# Altium schematic symbol library Analog Devices Operational Amplifiers.SchLib: 2102 symbols (part 27 of 35) (continued)
## ADA4851-4WYRUZ-R7
designator U?
Quad Channel Low Power Operational Amplifier, 130 MHz BW, 375 V/us SR, Industrial, 14-pin SOP (RU-14), Reel; Generic Part Number: ADA4851-4; Manufacturer: Analog Devices; PartNumber: ADA4851-4WYRUZ-R7; Amplifiers Per Package: 4; Automotive Qualified: Yes; Input Bias Current: 1.8uA; Input Offset Voltage: 600uV; Iq/Amp: 3.2mA; Small Signal Bandwidth: 130MHz; V Span Max: 12V; V Span Min: 2.7V; DatasheetVersion: Rev. J; PackageReference: RU-14; PackageDescription: 14-Pin Thin Shrink Small Outline Package, Body 5 x 4.4 mm, Pitch 0.65 mm; Supplier 1: Digi-Key; Supplier Part Number 1: ADA4851-4WYRUZ-R7TR-ND; Supplier 2: Digi-Key; Supplier Part Number 2: ADA4851-4WYRUZ-R7CT-ND; Supplier 3: Digi-Key; Supplier Part Number 3: ADA4851-4WYRUZ-R7DKR-ND; Supplier 4: Newark; Supplier Part Number 4: 14R8665; Slew Rate: 375V/us; Mounting Technology: Surface Mount; Code_JEDEC: MO-153AB-1; ComponentLink1Description: Manufacturer URL; ComponentLink1URL: http://www.analog.com/en/index.html; ComponentLink2Description: Datasheet; ComponentLink2URL: http://www.analog.com/static/imported-files/data_sheets/ADA4851-1_4851-2_4851-4.pdf; ComponentLink3Description: Package Specification; ComponentLink3URL: http://www.analog.com/static/imported-files/packages/36057385283879153717235186773RU14.pdf
footprint ADI-RU-14_N (SOP, 14-Leads, Body 5x4.4mm, Pitch 0.65mm, IPC Medium Density)
footprint ADI-RU-14_L (SOP, 14-Leads, Body 5x4.4mm, Pitch 0.65mm, IPC High Density)
footprint ADI-RU-14_M (SOP, 14-Leads, Body 5x4.4mm, Pitch 0.65mm, IPC Low Density)
pins on every part: 4 +VS (power), 11 -VS (power)
part A pins: 1 VOUT 1 (out), 2 -IN 1 (in), 3 +IN 1 (in)
part B pins: 5 +IN 2 (in), 6 -IN 2 (in), 7 VOUT 2 (out)
part C pins: 8 VOUT 3 (out), 9 -IN 3 (in), 10 +IN 3 (in)
part D pins: 12 +IN 4 (in), 13 -IN 4 (in), 14 VOUT 4 (out)

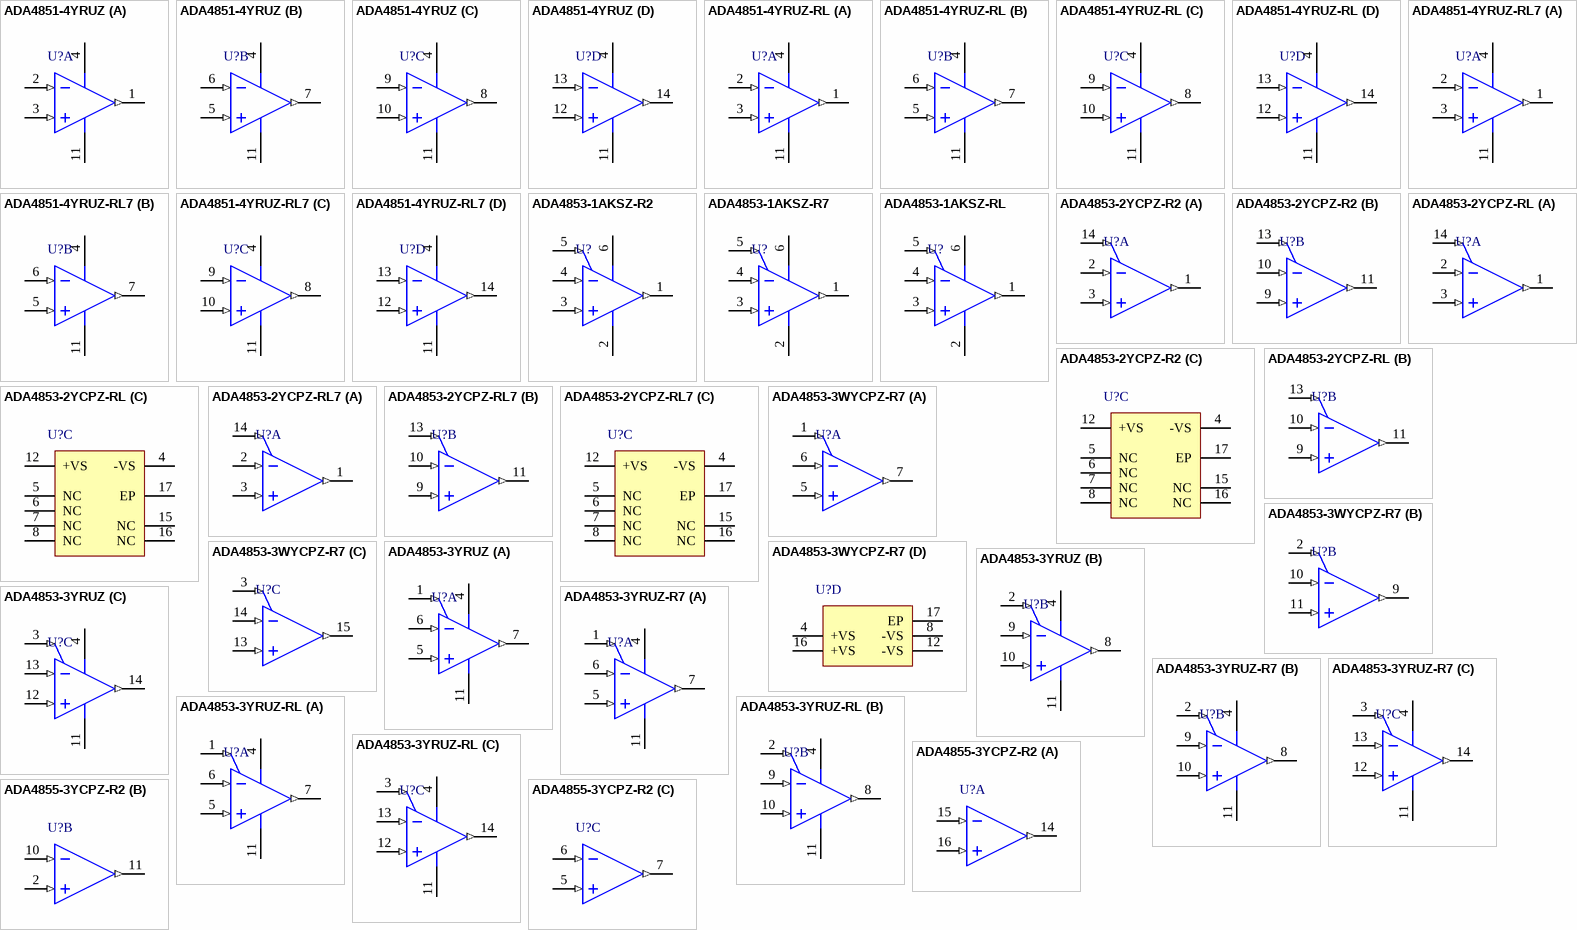
[diagram p84: symbols ADA4851-4YRUZ to ADA4855-3YCPZ-R2]

## ADA4851-4YRUZ
designator U?
Quad Channel Low Power Operational Amplifier, 130 MHz BW, 375 V/us SR, Industrial, 14-pin SOP (RU-14), Tube; Generic Part Number: ADA4851-4; Manufacturer: Analog Devices; PartNumber: ADA4851-4YRUZ; Amplifiers Per Package: 4; Automotive Qualified: Yes; Input Bias Current: 1.8uA; Input Offset Voltage: 600uV; Iq/Amp: 3.2mA; Small Signal Bandwidth: 130MHz; V Span Max: 12V; V Span Min: 2.7V; DatasheetVersion: Rev. J; PackageReference: RU-14; PackageDescription: 14-Pin Thin Shrink Small Outline Package, Body 5 x 4.4 mm, Pitch 0.65 mm; Supplier 1: Digi-Key; Supplier Part Number 1: ADA4851-4YRUZ-ND; Supplier 2: Farnell; Supplier Part Number 2: 1078230; Supplier 3: Newark; Supplier Part Number 3: 19M0649; Slew Rate: 375V/us; Mounting Technology: Surface Mount; Code_JEDEC: MO-153AB-1; ComponentLink1Description: Manufacturer URL; ComponentLink1URL: http://www.analog.com/en/index.html; ComponentLink2Description: Datasheet; ComponentLink2URL: http://www.analog.com/static/imported-files/data_sheets/ADA4851-1_4851-2_4851-4.pdf; ComponentLink3Description: Package Specification; ComponentLink3URL: http://www.analog.com/static/imported-files/packages/36057385283879153717235186773RU14.pdf
footprint ADI-RU-14_N (SOP, 14-Leads, Body 5x4.4mm, Pitch 0.65mm, IPC Medium Density)
footprint ADI-RU-14_L (SOP, 14-Leads, Body 5x4.4mm, Pitch 0.65mm, IPC High Density)
footprint ADI-RU-14_M (SOP, 14-Leads, Body 5x4.4mm, Pitch 0.65mm, IPC Low Density)
pins on every part: 4 +VS (power), 11 -VS (power)
part A pins: 1 VOUT 1 (out), 2 -IN 1 (in), 3 +IN 1 (in)
part B pins: 5 +IN 2 (in), 6 -IN 2 (in), 7 VOUT 2 (out)
part C pins: 8 VOUT 3 (out), 9 -IN 3 (in), 10 +IN 3 (in)
part D pins: 12 +IN 4 (in), 13 -IN 4 (in), 14 VOUT 4 (out)

## ADA4851-4YRUZ-RL
designator U?
Quad Channel Low Power Operational Amplifier, 130 MHz BW, 375 V/us SR, Industrial, 14-pin SOP (RU-14), Reel; Generic Part Number: ADA4851-4; Manufacturer: Analog Devices; PartNumber: ADA4851-4YRUZ-RL; Amplifiers Per Package: 4; Automotive Qualified: Yes; Input Bias Current: 1.8uA; Input Offset Voltage: 600uV; Iq/Amp: 3.2mA; Small Signal Bandwidth: 130MHz; V Span Max: 12V; V Span Min: 2.7V; DatasheetVersion: Rev. J; PackageReference: RU-14; PackageDescription: 14-Pin Thin Shrink Small Outline Package, Body 5 x 4.4 mm, Pitch 0.65 mm; Supplier 1: Digi-Key; Supplier Part Number 1: ADA4851-4YRUZ-RL-ND; Slew Rate: 375V/us; Mounting Technology: Surface Mount; Code_JEDEC: MO-153AB-1; ComponentLink1Description: Manufacturer URL; ComponentLink1URL: http://www.analog.com/en/index.html; ComponentLink2Description: Datasheet; ComponentLink2URL: http://www.analog.com/static/imported-files/data_sheets/ADA4851-1_4851-2_4851-4.pdf; ComponentLink3Description: Package Specification; ComponentLink3URL: http://www.analog.com/static/imported-files/packages/36057385283879153717235186773RU14.pdf
footprint ADI-RU-14_N (SOP, 14-Leads, Body 5x4.4mm, Pitch 0.65mm, IPC Medium Density)
footprint ADI-RU-14_L (SOP, 14-Leads, Body 5x4.4mm, Pitch 0.65mm, IPC High Density)
footprint ADI-RU-14_M (SOP, 14-Leads, Body 5x4.4mm, Pitch 0.65mm, IPC Low Density)
pins on every part: 4 +VS (power), 11 -VS (power)
part A pins: 1 VOUT 1 (out), 2 -IN 1 (in), 3 +IN 1 (in)
part B pins: 5 +IN 2 (in), 6 -IN 2 (in), 7 VOUT 2 (out)
part C pins: 8 VOUT 3 (out), 9 -IN 3 (in), 10 +IN 3 (in)
part D pins: 12 +IN 4 (in), 13 -IN 4 (in), 14 VOUT 4 (out)

## ADA4851-4YRUZ-RL7
designator U?
Quad Channel Low Power Operational Amplifier, 130 MHz BW, 375 V/us SR, Industrial, 14-pin SOP (RU-14), Reel; Generic Part Number: ADA4851-4; Manufacturer: Analog Devices; PartNumber: ADA4851-4YRUZ-RL7; Amplifiers Per Package: 4; Automotive Qualified: Yes; Input Bias Current: 1.8uA; Input Offset Voltage: 600uV; Iq/Amp: 3.2mA; Small Signal Bandwidth: 130MHz; V Span Max: 12V; V Span Min: 2.7V; DatasheetVersion: Rev. J; PackageReference: RU-14; PackageDescription: 14-Pin Thin Shrink Small Outline Package, Body 5 x 4.4 mm, Pitch 0.65 mm; Supplier 1: Digi-Key; Supplier Part Number 1: ADA4851-4YRUZ-RL7TR-ND; Supplier 2: Digi-Key; Supplier Part Number 2: ADA4851-4YRUZ-RL7CT-ND; Supplier 3: Digi-Key; Supplier Part Number 3: ADA4851-4YRUZ-RL7DKR-ND; Supplier 4: Newark; Supplier Part Number 4: 59K0911; Slew Rate: 375V/us; Mounting Technology: Surface Mount; Code_JEDEC: MO-153AB-1; ComponentLink1Description: Manufacturer URL; ComponentLink1URL: http://www.analog.com/en/index.html; ComponentLink2Description: Datasheet; ComponentLink2URL: http://www.analog.com/static/imported-files/data_sheets/ADA4851-1_4851-2_4851-4.pdf; ComponentLink3Description: Package Specification; ComponentLink3URL: http://www.analog.com/static/imported-files/packages/36057385283879153717235186773RU14.pdf
footprint ADI-RU-14_N (SOP, 14-Leads, Body 5x4.4mm, Pitch 0.65mm, IPC Medium Density)
footprint ADI-RU-14_L (SOP, 14-Leads, Body 5x4.4mm, Pitch 0.65mm, IPC High Density)
footprint ADI-RU-14_M (SOP, 14-Leads, Body 5x4.4mm, Pitch 0.65mm, IPC Low Density)
pins on every part: 4 +VS (power), 11 -VS (power)
part A pins: 1 VOUT 1 (out), 2 -IN 1 (in), 3 +IN 1 (in)
part B pins: 5 +IN 2 (in), 6 -IN 2 (in), 7 VOUT 2 (out)
part C pins: 8 VOUT 3 (out), 9 -IN 3 (in), 10 +IN 3 (in)
part D pins: 12 +IN 4 (in), 13 -IN 4 (in), 14 VOUT 4 (out)

## ADA4853-1AKSZ-R2
designator U?
Single Channel Ultra Low Power-Down Current Operational Amplifier, 90MHz BW, 100 V/us SR, Industrial, 6-pin SOT23 (KS-6), Reel; Generic Part Number: ADA4853-1; Manufacturer: Analog Devices; PartNumber: ADA4853-1AKSZ-R2; Amplifiers Per Package: 1; Input Bias Current: 1uA; Input Offset Voltage: 1mV; Iq/Amp: 1.6mA; V Span Max: 5V; V Span Min: 2.65V; DatasheetVersion: Rev. F; PackageVersion: 072809-A; PackageReference: KS-6; PackageDescription: 6-Pin Thin Shrink Small Outline Transistor Package, Body 2 x 1.25 mm, Pitch 0.65 mm; Supplier 1: Digi-Key; Supplier Part Number 1: ADA4853-1AKSZ-R2CT-ND; Supplier 2: Digi-Key; Supplier Part Number 2: ADA4853-1AKSZ-R2DKR-ND; Supplier 3: Farnell; Supplier Part Number 3: 2192170; Supplier 4: Newark; Supplier Part Number 4: 12M7610; Slew Rate: 100V/us; Small Signal Bandwidth: 90MHz; Mounting Technology: Surface Mount; Code_JEDEC: MO-203-AB; ComponentLink1Description: Manufacturer URL; ComponentLink1URL: http://www.analog.com/en/index.html; ComponentLink2Description: Datasheet; ComponentLink2URL: http://www.analog.com/static/imported-files/data_sheets/ADA4853-1_4853-2_4853-3.pdf; ComponentLink3Description: Package Specification; ComponentLink3URL: http://www.analog.com/static/imported-files/packages/PKG_PDF/SC70(KS)/KS_6.pdf; ComponentLink4Description: Reference Circuit; ComponentLink4URL: http://www.analog.com/en/all-operational-amplifiers-op-amps/operational-amplifiers-op-amps/ada4853-1/products/product.html#product-recommendations
footprint ADI-KS-6_N (SOT23, 6-Leads, Body 2x1.25mm, Pitch 0.65mm, IPC Medium Density)
footprint ADI-KS-6_L (SOT23, 6-Leads, Body 2x1.25mm, Pitch 0.65mm, IPC High Density)
footprint ADI-KS-6_M (SOT23, 6-Leads, Body 2x1.25mm, Pitch 0.65mm, IPC Low Density)
pins: 1 VOUT (out), 2 -VS (power), 3 +IN (in), 4 -IN (in), 5 DISABLE (in), 6 +VS (power)

## ADA4853-1AKSZ-R7
designator U?
Single Channel Ultra Low Power-Down Current Operational Amplifier, 90MHz BW, 100 V/us SR, Industrial, 6-pin SOT23 (KS-6), Reel; Generic Part Number: ADA4853-1; Manufacturer: Analog Devices; PartNumber: ADA4853-1AKSZ-R7; Amplifiers Per Package: 1; Input Bias Current: 1uA; Input Offset Voltage: 1mV; Iq/Amp: 1.6mA; V Span Max: 5V; V Span Min: 2.65V; DatasheetVersion: Rev. F; PackageVersion: 072809-A; PackageReference: KS-6; PackageDescription: 6-Pin Thin Shrink Small Outline Transistor Package, Body 2 x 1.25 mm, Pitch 0.65 mm; Supplier 1: Digi-Key; Supplier Part Number 1: ADA4853-1AKSZ-R7TR-ND; Supplier 2: Digi-Key; Supplier Part Number 2: ADA4853-1AKSZ-R7CT-ND; Supplier 3: Digi-Key; Supplier Part Number 3: ADA4853-1AKSZ-R7DKR-ND; Supplier 4: Newark; Supplier Part Number 4: 12M7611; Supplier 5: Newark; Supplier Part Number 5: 67W2626; Slew Rate: 100V/us; Small Signal Bandwidth: 90MHz; Mounting Technology: Surface Mount; Code_JEDEC: MO-203-AB; ComponentLink1Description: Manufacturer URL; ComponentLink1URL: http://www.analog.com/en/index.html; ComponentLink2Description: Datasheet; ComponentLink2URL: http://www.analog.com/static/imported-files/data_sheets/ADA4853-1_4853-2_4853-3.pdf; ComponentLink3Description: Package Specification; ComponentLink3URL: http://www.analog.com/static/imported-files/packages/PKG_PDF/SC70(KS)/KS_6.pdf; ComponentLink4Description: Reference Circuit; ComponentLink4URL: http://www.analog.com/en/all-operational-amplifiers-op-amps/operational-amplifiers-op-amps/ada4853-1/products/product.html#product-recommendations
footprint ADI-KS-6_N (SOT23, 6-Leads, Body 2x1.25mm, Pitch 0.65mm, IPC Medium Density)
footprint ADI-KS-6_L (SOT23, 6-Leads, Body 2x1.25mm, Pitch 0.65mm, IPC High Density)
footprint ADI-KS-6_M (SOT23, 6-Leads, Body 2x1.25mm, Pitch 0.65mm, IPC Low Density)
pins: 1 VOUT (out), 2 -VS (power), 3 +IN (in), 4 -IN (in), 5 DISABLE (in), 6 +VS (power)

## ADA4853-1AKSZ-RL
designator U?
Single Channel Ultra Low Power-Down Current Operational Amplifier, 90MHz BW, 100 V/us SR, Industrial, 6-pin SOT23 (KS-6), Reel; Generic Part Number: ADA4853-1; Manufacturer: Analog Devices; PartNumber: ADA4853-1AKSZ-RL; Amplifiers Per Package: 1; Input Bias Current: 1uA; Input Offset Voltage: 1mV; Iq/Amp: 1.6mA; V Span Max: 5V; V Span Min: 2.65V; DatasheetVersion: Rev. F; PackageVersion: 072809-A; PackageReference: KS-6; PackageDescription: 6-Pin Thin Shrink Small Outline Transistor Package, Body 2 x 1.25 mm, Pitch 0.65 mm; Supplier 1: Digi-Key; Supplier Part Number 1: ADA4853-1AKSZ-RL-ND; Slew Rate: 100V/us; Small Signal Bandwidth: 90MHz; Mounting Technology: Surface Mount; Code_JEDEC: MO-203-AB; ComponentLink1Description: Manufacturer URL; ComponentLink1URL: http://www.analog.com/en/index.html; ComponentLink2Description: Datasheet; ComponentLink2URL: http://www.analog.com/static/imported-files/data_sheets/ADA4853-1_4853-2_4853-3.pdf; ComponentLink3Description: Package Specification; ComponentLink3URL: http://www.analog.com/static/imported-files/packages/PKG_PDF/SC70(KS)/KS_6.pdf; ComponentLink4Description: Reference Circuit; ComponentLink4URL: http://www.analog.com/en/all-operational-amplifiers-op-amps/operational-amplifiers-op-amps/ada4853-1/products/product.html#product-recommendations
footprint ADI-KS-6_N (SOT23, 6-Leads, Body 2x1.25mm, Pitch 0.65mm, IPC Medium Density)
footprint ADI-KS-6_L (SOT23, 6-Leads, Body 2x1.25mm, Pitch 0.65mm, IPC High Density)
footprint ADI-KS-6_M (SOT23, 6-Leads, Body 2x1.25mm, Pitch 0.65mm, IPC Low Density)
pins: 1 VOUT (out), 2 -VS (power), 3 +IN (in), 4 -IN (in), 5 DISABLE (in), 6 +VS (power)

## ADA4853-2YCPZ-R2
designator U?
Double Channel Ultra Low Power-Down Current Operational Amplifier, 100 MHz BW, 120 V/us SR, Industrial, 16-pin QFN (CP-16-3), Reel; Generic Part Number: ADA4853-2; Manufacturer: Analog Devices; PartNumber: ADA4853-2YCPZ-R2; Amplifiers Per Package: 2; Input Bias Current: 1uA; Input Offset Voltage: 2mV; Iq/Amp: 1.6mA; Small Signal Bandwidth: 100MHz; V Span Max: 5V; V Span Min: 2.65V; DatasheetVersion: Rev. F; PackageReference: CP-16-3; PackageDescription: 16-Pin Lead Frame Chip Scale Package, Body 3 x 3 mm, Pitch 0.5 mm; Supplier 1: Digi-Key; Supplier Part Number 1: ADA4853-2YCPZ-R2CT-ND; Supplier 2: Digi-Key; Supplier Part Number 2: ADA4853-2YCPZ-R2DKR-ND; Slew Rate: 120V/us; Mounting Technology: Surface Mount; Code_JEDEC: MO-220-VEED-2; ComponentLink1Description: Manufacturer URL; ComponentLink1URL: http://www.analog.com/en/index.html; ComponentLink2Description: Datasheet; ComponentLink2URL: http://www.analog.com/static/imported-files/data_sheets/ADA4853-1_4853-2_4853-3.pdf; ComponentLink3Description: Package Specification; ComponentLink3URL: http://www.analog.com/static/imported-files/packages/PKG_PDF/LFCSP(CP)/CP_16_3.pdf; ComponentLink4Description: Reference Circuit; ComponentLink4URL: http://www.analog.com/en/all-operational-amplifiers-op-amps/operational-amplifiers-op-amps/ada4853-2/products/product.html#product-recommendations
footprint ADI-CP-16-3_N (QFN, 16-Leads, Body 3x3mm, Pitch 0.5mm, Thermal Pad 1.5x1.5mm, IPC Medium Density)
footprint ADI-CP-16-3_L (QFN, 16-Leads, Body 3x3mm, Pitch 0.5mm, Thermal Pad 1.5x1.5mm, IPC High Density)
footprint ADI-CP-16-3_M (QFN, 16-Leads, Body 3x3mm, Pitch 0.5mm, Thermal Pad 1.5x1.5mm, IPC Low Density)
part A pins: 1 VOUT 1 (out), 2 -IN 1 (in), 3 +IN 1 (in), 14 DISABLE 1 (in)
part B pins: 9 +IN 2 (in), 10 -IN 2 (in), 11 VOUT 2 (out), 13 DISABLE 2 (in)
part C pins: 4 -VS (power), 5 NC, 6 NC, 7 NC, 8 NC, 12 +VS (power), 15 NC, 16 NC, 17 EP (power) "EXPOSED DIE PAD MUST BE CONNECTED TO GND."

## ADA4853-2YCPZ-RL
designator U?
Double Channel Ultra Low Power-Down Current Operational Amplifier, 100 MHz BW, 120 V/us SR, Industrial, 16-pin QFN (CP-16-3), Reel; Generic Part Number: ADA4853-2; Manufacturer: Analog Devices; PartNumber: ADA4853-2YCPZ-RL; Amplifiers Per Package: 2; Input Bias Current: 1uA; Input Offset Voltage: 2mV; Iq/Amp: 1.6mA; Small Signal Bandwidth: 100MHz; V Span Max: 5V; V Span Min: 2.65V; DatasheetVersion: Rev. F; PackageReference: CP-16-3; PackageDescription: 16-Pin Lead Frame Chip Scale Package, Body 3 x 3 mm, Pitch 0.5 mm; Supplier 1: Digi-Key; Supplier Part Number 1: ADA4853-2YCPZ-RL-ND; Slew Rate: 120V/us; Mounting Technology: Surface Mount; Code_JEDEC: MO-220-VEED-2; ComponentLink1Description: Manufacturer URL; ComponentLink1URL: http://www.analog.com/en/index.html; ComponentLink2Description: Datasheet; ComponentLink2URL: http://www.analog.com/static/imported-files/data_sheets/ADA4853-1_4853-2_4853-3.pdf; ComponentLink3Description: Package Specification; ComponentLink3URL: http://www.analog.com/static/imported-files/packages/PKG_PDF/LFCSP(CP)/CP_16_3.pdf; ComponentLink4Description: Reference Circuit; ComponentLink4URL: http://www.analog.com/en/all-operational-amplifiers-op-amps/operational-amplifiers-op-amps/ada4853-2/products/product.html#product-recommendations
footprint ADI-CP-16-3_N (QFN, 16-Leads, Body 3x3mm, Pitch 0.5mm, Thermal Pad 1.5x1.5mm, IPC Medium Density)
footprint ADI-CP-16-3_L (QFN, 16-Leads, Body 3x3mm, Pitch 0.5mm, Thermal Pad 1.5x1.5mm, IPC High Density)
footprint ADI-CP-16-3_M (QFN, 16-Leads, Body 3x3mm, Pitch 0.5mm, Thermal Pad 1.5x1.5mm, IPC Low Density)
part A pins: 1 VOUT 1 (out), 2 -IN 1 (in), 3 +IN 1 (in), 14 DISABLE 1 (in)
part B pins: 9 +IN 2 (in), 10 -IN 2 (in), 11 VOUT 2 (out), 13 DISABLE 2 (in)
part C pins: 4 -VS (power), 5 NC, 6 NC, 7 NC, 8 NC, 12 +VS (power), 15 NC, 16 NC, 17 EP (power) "EXPOSED DIE PAD MUST BE CONNECTED TO GND."

## ADA4853-2YCPZ-RL7
designator U?
Double Channel Ultra Low Power-Down Current Operational Amplifier, 100 MHz BW, 120 V/us SR, Industrial, 16-pin QFN (CP-16-3), Reel; Generic Part Number: ADA4853-2; Manufacturer: Analog Devices; PartNumber: ADA4853-2YCPZ-RL7; Amplifiers Per Package: 2; Input Bias Current: 1uA; Input Offset Voltage: 2mV; Iq/Amp: 1.6mA; Small Signal Bandwidth: 100MHz; V Span Max: 5V; V Span Min: 2.65V; DatasheetVersion: Rev. F; PackageReference: CP-16-3; PackageDescription: 16-Pin Lead Frame Chip Scale Package, Body 3 x 3 mm, Pitch 0.5 mm; Supplier 1: Digi-Key; Supplier Part Number 1: ADA4853-2YCPZ-RL7TR-ND; Supplier 2: Digi-Key; Supplier Part Number 2: ADA4853-2YCPZ-RL7CT-ND; Supplier 3: Digi-Key; Supplier Part Number 3: ADA4853-2YCPZ-RL7DKR-ND; Slew Rate: 120V/us; Mounting Technology: Surface Mount; Code_JEDEC: MO-220-VEED-2; ComponentLink1Description: Manufacturer URL; ComponentLink1URL: http://www.analog.com/en/index.html; ComponentLink2Description: Datasheet; ComponentLink2URL: http://www.analog.com/static/imported-files/data_sheets/ADA4853-1_4853-2_4853-3.pdf; ComponentLink3Description: Package Specification; ComponentLink3URL: http://www.analog.com/static/imported-files/packages/PKG_PDF/LFCSP(CP)/CP_16_3.pdf; ComponentLink4Description: Reference Circuit; ComponentLink4URL: http://www.analog.com/en/all-operational-amplifiers-op-amps/operational-amplifiers-op-amps/ada4853-2/products/product.html#product-recommendations
footprint ADI-CP-16-3_N (QFN, 16-Leads, Body 3x3mm, Pitch 0.5mm, Thermal Pad 1.5x1.5mm, IPC Medium Density)
footprint ADI-CP-16-3_L (QFN, 16-Leads, Body 3x3mm, Pitch 0.5mm, Thermal Pad 1.5x1.5mm, IPC High Density)
footprint ADI-CP-16-3_M (QFN, 16-Leads, Body 3x3mm, Pitch 0.5mm, Thermal Pad 1.5x1.5mm, IPC Low Density)
part A pins: 1 VOUT 1 (out), 2 -IN 1 (in), 3 +IN 1 (in), 14 DISABLE 1 (in)
part B pins: 9 +IN 2 (in), 10 -IN 2 (in), 11 VOUT 2 (out), 13 DISABLE 2 (in)
part C pins: 4 -VS (power), 5 NC, 6 NC, 7 NC, 8 NC, 12 +VS (power), 15 NC, 16 NC, 17 EP (power) "EXPOSED DIE PAD MUST BE CONNECTED TO GND."

## ADA4853-3WYCPZ-R7
designator U?
3 Channel Ultra Low Power-Down Current Operational Amplifier, 100 MHz BW, 120 V/us SR, Industrial, 16-pin QFN (CP-16-3), Reel; Generic Part Number: ADA4853-3; Manufacturer: Analog Devices; PartNumber: ADA4853-3WYCPZ-R7; Amplifiers Per Package: 3; Automotive Qualified: Yes; Input Bias Current: 1uA; Input Offset Voltage: 1mV; Iq/Amp: 1.4mA; Small Signal Bandwidth: 100MHz; V Span Max: 5V; V Span Min: 2.65V; DatasheetVersion: Rev. F; PackageReference: CP-16-3; PackageDescription: 16-Pin Lead Frame Chip Scale Package, Body 3 x 3 mm, Pitch 0.5 mm; Slew Rate: 120V/us; Mounting Technology: Surface Mount; Code_JEDEC: MO-220-VEED-2; ComponentLink1Description: Manufacturer URL; ComponentLink1URL: http://www.analog.com/en/index.html; ComponentLink2Description: Datasheet; ComponentLink2URL: http://www.analog.com/static/imported-files/data_sheets/ADA4853-1_4853-2_4853-3.pdf; ComponentLink3Description: Package Specification; ComponentLink3URL: http://www.analog.com/static/imported-files/packages/PKG_PDF/LFCSP(CP)/CP_16_3.pdf; ComponentLink4Description: Reference Circuit; ComponentLink4URL: http://www.analog.com/en/all-operational-amplifiers-op-amps/operational-amplifiers-op-amps/ada4853-3/products/product.html#product-recommendations
footprint ADI-CP-16-3_N (QFN, 16-Leads, Body 3x3mm, Pitch 0.5mm, Thermal Pad 1.5x1.5mm, IPC Medium Density)
footprint ADI-CP-16-3_L (QFN, 16-Leads, Body 3x3mm, Pitch 0.5mm, Thermal Pad 1.5x1.5mm, IPC High Density)
footprint ADI-CP-16-3_M (QFN, 16-Leads, Body 3x3mm, Pitch 0.5mm, Thermal Pad 1.5x1.5mm, IPC Low Density)
part A pins: 1 DISABLE 1 (in), 5 +IN 1 (in), 6 -IN 1 (in), 7 VOUT 1 (out)
part B pins: 2 DISABLE 2 (in), 9 VOUT 2 (out), 10 -IN 2 (in), 11 +IN 2 (in)
part C pins: 3 DISABLE 3 (in), 13 +IN 3 (in), 14 -IN 3 (in), 15 VOUT 3 (out)
part D pins: 4 +VS (power), 8 -VS (power), 12 -VS (power), 16 +VS (power), 17 EP (power)

## ADA4853-3YRUZ
designator U?
3 Channel Ultra Low Power-Down Current Operational Amplifier, 100 MHz BW, 120 V/us SR, Industrial, 14-pin SOP (RU-14), Tube; Generic Part Number: ADA4853-3; Manufacturer: Analog Devices; PartNumber: ADA4853-3YRUZ; Amplifiers Per Package: 3; Automotive Qualified: Yes; Input Bias Current: 1uA; Input Offset Voltage: 1mV; Iq/Amp: 1.4mA; Small Signal Bandwidth: 100MHz; V Span Max: 5V; V Span Min: 2.65V; DatasheetVersion: Rev. F; PackageReference: RU-14; PackageDescription: 14-Pin Thin Shrink Small Outline Package, Body 5 x 4.4 mm, Pitch 0.65 mm; Supplier 1: Digi-Key; Supplier Part Number 1: ADA4853-3YRUZ-ND; Supplier 2: Farnell; Supplier Part Number 2: 1498692; Supplier 3: Newark; Supplier Part Number 3: 15P0326; Slew Rate: 120V/us; Mounting Technology: Surface Mount; Code_JEDEC: MO-153AB-1; ComponentLink1Description: Manufacturer URL; ComponentLink1URL: http://www.analog.com/en/index.html; ComponentLink2Description: Datasheet; ComponentLink2URL: http://www.analog.com/static/imported-files/data_sheets/ADA4853-1_4853-2_4853-3.pdf; ComponentLink3Description: Package Specification; ComponentLink3URL: http://www.analog.com/static/imported-files/packages/36057385283879153717235186773RU14.pdf; ComponentLink4Description: Reference Circuit; ComponentLink4URL: http://www.analog.com/en/all-operational-amplifiers-op-amps/operational-amplifiers-op-amps/ada4853-3/products/product.html#product-recommendations
footprint ADI-RU-14_N (SOP, 14-Leads, Body 5x4.4mm, Pitch 0.65mm, IPC Medium Density)
footprint ADI-RU-14_L (SOP, 14-Leads, Body 5x4.4mm, Pitch 0.65mm, IPC High Density)
footprint ADI-RU-14_M (SOP, 14-Leads, Body 5x4.4mm, Pitch 0.65mm, IPC Low Density)
pins on every part: 4 +VS (power), 11 -VS (power)
part A pins: 1 DISABLE 1 (in), 5 +IN 1 (in), 6 -IN 1 (in), 7 VOUT 1 (out)
part B pins: 2 DISABLE 2 (in), 8 VOUT 2 (out), 9 -IN 2 (in), 10 +IN 2 (in)
part C pins: 3 DISABLE 3 (in), 12 +IN 3 (in), 13 -IN 3 (in), 14 VOUT 3 (out)

## ADA4853-3YRUZ-R7
designator U?
3 Channel Ultra Low Power-Down Current Operational Amplifier, 100 MHz BW, 120 V/us SR, Industrial, 14-pin SOP (RU-14), Reel; Generic Part Number: ADA4853-3; Manufacturer: Analog Devices; PartNumber: ADA4853-3YRUZ-R7; Amplifiers Per Package: 3; Automotive Qualified: Yes; Input Bias Current: 1uA; Input Offset Voltage: 1mV; Iq/Amp: 1.4mA; Small Signal Bandwidth: 100MHz; V Span Max: 5V; V Span Min: 2.65V; DatasheetVersion: Rev. F; PackageReference: RU-14; PackageDescription: 14-Pin Thin Shrink Small Outline Package, Body 5 x 4.4 mm, Pitch 0.65 mm; Supplier 1: Digi-Key; Supplier Part Number 1: ADA4853-3YRUZ-R7-ND; Slew Rate: 120V/us; Mounting Technology: Surface Mount; Code_JEDEC: MO-153AB-1; ComponentLink1Description: Manufacturer URL; ComponentLink1URL: http://www.analog.com/en/index.html; ComponentLink2Description: Datasheet; ComponentLink2URL: http://www.analog.com/static/imported-files/data_sheets/ADA4853-1_4853-2_4853-3.pdf; ComponentLink3Description: Package Specification; ComponentLink3URL: http://www.analog.com/static/imported-files/packages/36057385283879153717235186773RU14.pdf; ComponentLink4Description: Reference Circuit; ComponentLink4URL: http://www.analog.com/en/all-operational-amplifiers-op-amps/operational-amplifiers-op-amps/ada4853-3/products/product.html#product-recommendations
footprint ADI-RU-14_N (SOP, 14-Leads, Body 5x4.4mm, Pitch 0.65mm, IPC Medium Density)
footprint ADI-RU-14_L (SOP, 14-Leads, Body 5x4.4mm, Pitch 0.65mm, IPC High Density)
footprint ADI-RU-14_M (SOP, 14-Leads, Body 5x4.4mm, Pitch 0.65mm, IPC Low Density)
pins on every part: 4 +VS (power), 11 -VS (power)
part A pins: 1 DISABLE 1 (in), 5 +IN 1 (in), 6 -IN 1 (in), 7 VOUT 1 (out)
part B pins: 2 DISABLE 2 (in), 8 VOUT 2 (out), 9 -IN 2 (in), 10 +IN 2 (in)
part C pins: 3 DISABLE 3 (in), 12 +IN 3 (in), 13 -IN 3 (in), 14 VOUT 3 (out)
